# Altium footprint library JL_PCB.PCBLIB: 1112 footprints (part 29 of 71)
Each footprint in its own frame and in the unit in brackets; x right, y up, seen from the top. Pads: shape width x height; smd on the part's side, far side on the other; paste and mask are expansions set on the pad; w line width, h text height; cw(c..) or ccw(c..) is an arc to the next point about the centre after c.
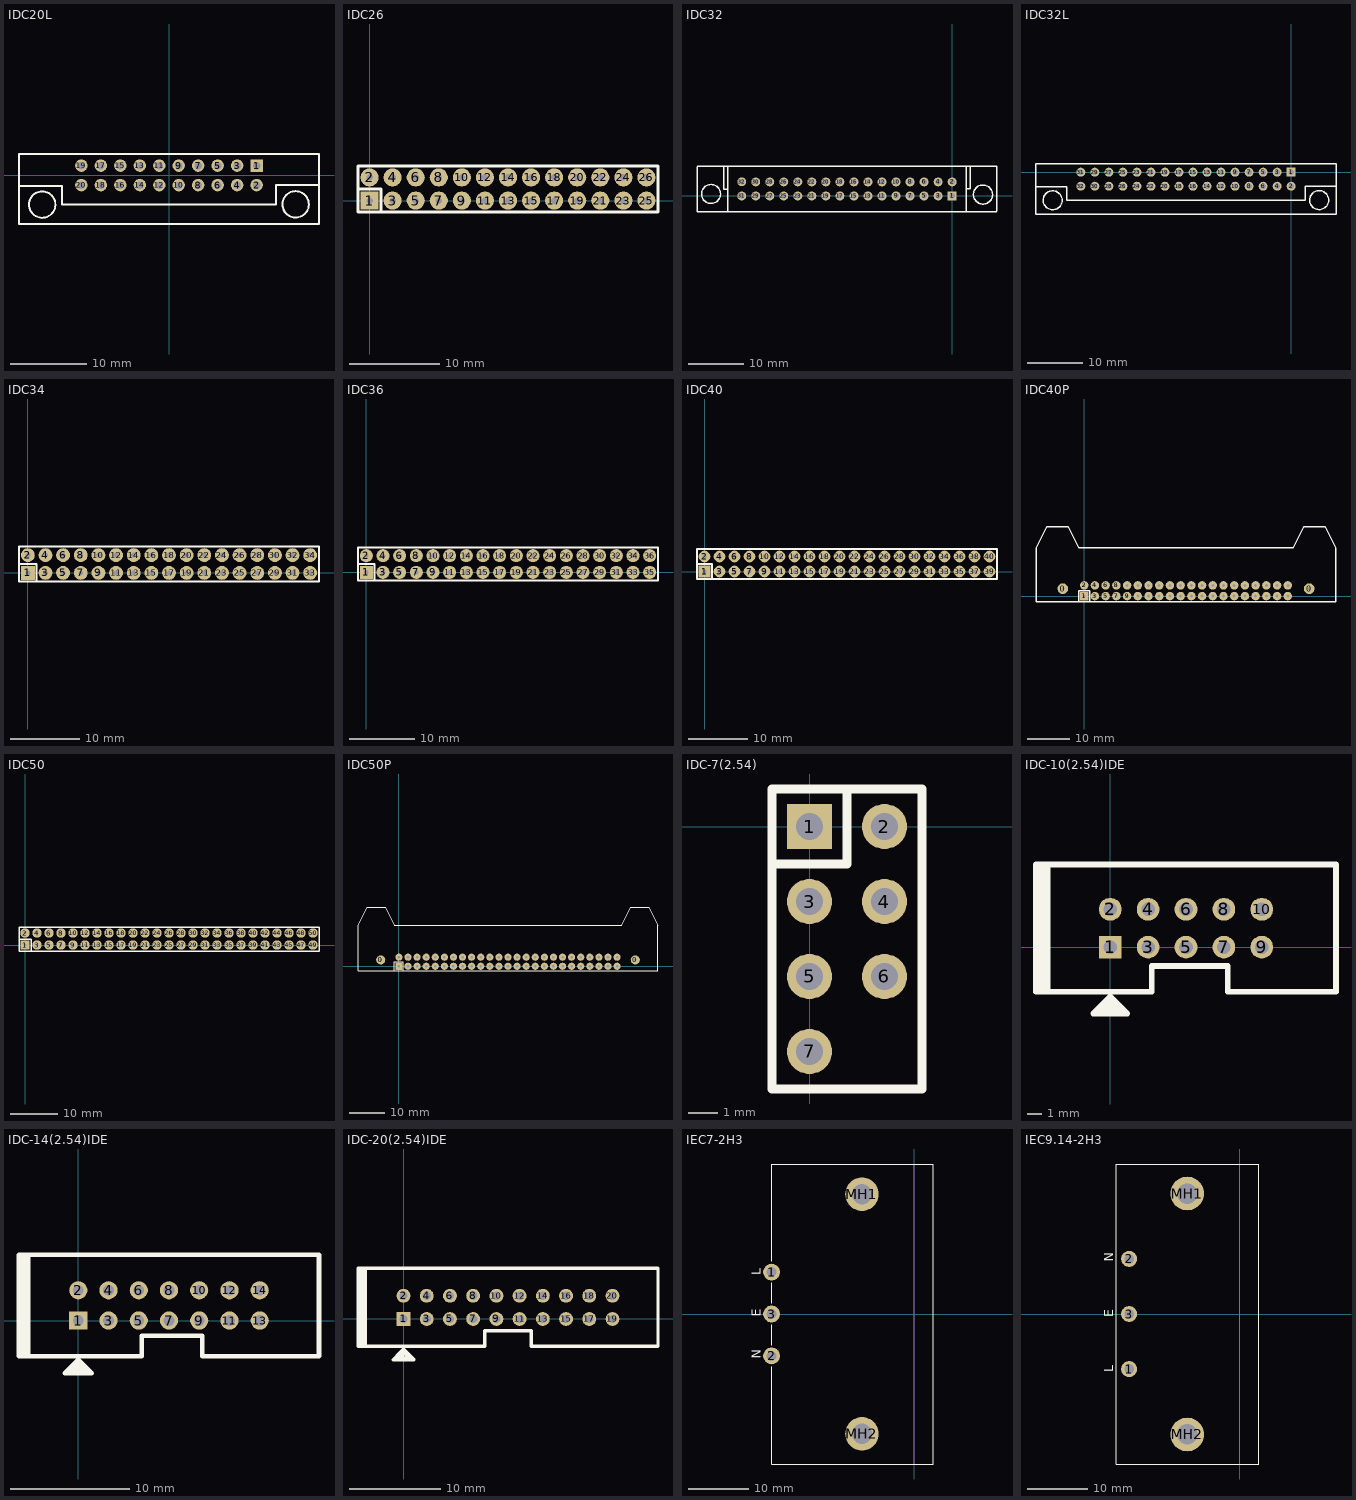
[diagram p28: the footprints below, top view; thin cyan lines are the x and y axes]

## IDC20L [mm]
pads (20):
  rect 1.618x1.618 hole 1: 1(11.43,1.27)
  round 1.618 hole 1: 2(11.43,-1.27) 3(8.89,1.27) 4(8.89,-1.27) 5(6.35,1.27) 6(6.35,-1.27) 7(3.81,1.27) 8(3.81,-1.27) 9(1.27,1.27) 10(1.27,-1.27) 11(-1.27,1.27) 12(-1.27,-1.27) 13(-3.81,1.27) 14(-3.81,-1.27) 15(-6.35,1.27) 16(-6.35,-1.27) 17(-8.89,1.27) 18(-8.89,-1.27) 19(-11.43,1.27) 20(-11.43,-1.27)
TopOverlay:
  lines w0.254: -14.814,-3.858 cw(c-16.535,-3.81) -14.814,-3.81 ; 18.231,-3.833 cw(c16.51,-3.785) 18.232,-3.785 ; -19.558,-1.397 -19.558,2.794 19.558,2.794 19.558,-1.27 ; -19.558,-1.397 -13.97,-1.397 -13.97,-3.81 13.97,-3.81 13.97,-1.27 19.558,-1.27 ; -19.558,-1.397 -19.558,-6.35 19.558,-6.35 19.558,-1.27

## IDC26 [mm]
pads (26):
  rect 2x2 hole 0.711: 1(0,0)
  round 2 hole 0.711: 2(0,2.54) 3(2.54,0) 4(2.54,2.54) 5(5.08,0) 6(5.08,2.54) 7(7.62,0) 8(7.62,2.54) 9(10.16,0) 10(10.16,2.54) 11(12.7,0) 12(12.7,2.54) 13(15.24,0) 14(15.24,2.54) 15(17.78,0) 16(17.78,2.54) 17(20.32,0) 18(20.32,2.54) 19(22.86,0) 20(22.86,2.54) 21(25.4,0) 22(25.4,2.54) 23(27.94,0) 24(27.94,2.54) 25(30.48,0) 26(30.48,2.54)
TopOverlay:
  lines w0.305: -1.27,1.27 1.27,1.27 1.27,-1.27 ; -1.27,-1.27 31.75,-1.27 31.75,3.81 -1.27,3.81 -1.27,-1.27

## IDC32 [mm]
pads (32):
  rect 1.618x1.618 hole 1: 1(0,0)
  round 1.618 hole 1: 2(0,2.54) 3(-2.54,0) 4(-2.54,2.54) 5(-5.08,0) 6(-5.08,2.54) 7(-7.62,0) 8(-7.62,2.54) 9(-10.16,0) 10(-10.16,2.54) 11(-12.7,0) 12(-12.7,2.54) 13(-15.24,0) 14(-15.24,2.54) 15(-17.78,0) 16(-17.78,2.54) 17(-20.32,0) 18(-20.32,2.54) 19(-22.86,0) 20(-22.86,2.54) 21(-25.4,0) 22(-25.4,2.54) 23(-27.94,0) 24(-27.94,2.54) 25(-30.48,0) 26(-30.48,2.54) 27(-33.02,0) 28(-33.02,2.54) 29(-35.56,0) 30(-35.56,2.54) 31(-38.1,0) 32(-38.1,2.565)
TopOverlay:
  lines w0.254: -46.203,5.309 -46.203,-2.819 8.103,-2.819 ; -46.177,5.334 8.128,5.334 8.128,-2.794 ; -41.942,0.307 cw(c-43.663,0.356) -41.941,0.356 ; -41.377,5.309 -41.377,1.245 -40.615,1.245 ; -40.615,-2.819 -40.615,5.182 ; 2.54,-2.794 2.54,5.207 ; 2.54,1.27 3.302,1.27 3.302,5.334 ; 7.314,0.2 cw(c5.588,0.254) 7.315,0.278

## IDC32L [mm]
pads (32):
  rect 1.618x1.618 hole 1: 1(0,0)
  round 1.618 hole 1: 2(0,-2.54) 3(-2.54,0) 4(-2.54,-2.54) 5(-5.08,0) 6(-5.08,-2.54) 7(-7.62,0) 8(-7.62,-2.54) 9(-10.16,0) 10(-10.16,-2.54) 11(-12.7,0) 12(-12.7,-2.54) 13(-15.24,0) 14(-15.24,-2.54) 15(-17.78,0) 16(-17.78,-2.54) 17(-20.32,0) 18(-20.32,-2.54) 19(-22.86,0) 20(-22.86,-2.54) 21(-25.4,0) 22(-25.4,-2.54) 23(-27.94,0) 24(-27.94,-2.54) 25(-30.48,0) 26(-30.48,-2.54) 27(-33.02,0) 28(-33.02,-2.54) 29(-35.56,0) 30(-35.56,-2.54) 31(-38.1,0) 32(-38.1,-2.54)
TopOverlay:
  lines w0.254: -41.484,-5.128 cw(c-43.205,-5.08) -41.484,-5.08 ; -30.988,1.524 8.128,1.524 8.128,-2.54 ; -30.836,1.524 -46.228,1.524 -46.228,-2.667 ; 6.801,-5.103 cw(c5.08,-5.055) 6.802,-5.055 ; -46.228,-2.667 -40.64,-2.667 -40.64,-5.08 -25.4,-5.08 2.54,-5.08 2.54,-2.54 8.128,-2.54 ; -46.228,-2.667 -46.228,-7.62 -30.988,-7.62 8.128,-7.62 8.128,-2.54

## IDC34 [mm]
pads (34):
  rect 2x2 hole 0.711: 1(0,0)
  round 2 hole 0.711: 2(0,2.54) 3(2.54,0) 4(2.54,2.54) 5(5.08,0) 6(5.08,2.54) 7(7.62,0) 8(7.62,2.54) 9(10.16,0) 10(10.16,2.54) 11(12.7,0) 12(12.7,2.54) 13(15.24,0) 14(15.24,2.54) 15(17.78,0) 16(17.78,2.54) 17(20.32,0) 18(20.32,2.54) 19(22.86,0) 20(22.86,2.54) 21(25.4,0) 22(25.4,2.54) 23(27.94,0) 24(27.94,2.54) 25(30.48,0) 26(30.48,2.54) 27(33.02,0) 28(33.02,2.54) 29(35.56,0) 30(35.56,2.54) 31(38.1,0) 32(38.1,2.54) 33(40.64,0) 34(40.64,2.54)
TopOverlay:
  lines w0.305: -1.27,1.27 1.27,1.27 1.27,-1.27 ; -1.27,-1.27 41.91,-1.27 41.91,3.81 -1.27,3.81 -1.27,-1.27

## IDC36 [mm]
pads (36):
  rect 2x2 hole 0.711: 1(0,0)
  round 2 hole 0.711: 2(0,2.54) 3(2.54,0) 4(2.54,2.54) 5(5.08,0) 6(5.08,2.54) 7(7.62,0) 8(7.62,2.54) 9(10.16,0) 10(10.16,2.54) 11(12.7,0) 12(12.7,2.54) 13(15.24,0) 14(15.24,2.54) 15(17.78,0) 16(17.78,2.54) 17(20.32,0) 18(20.32,2.54) 19(22.86,0) 20(22.86,2.54) 21(25.4,0) 22(25.4,2.54) 23(27.94,0) 24(27.94,2.54) 25(30.48,0) 26(30.48,2.54) 27(33.02,0) 28(33.02,2.54) 29(35.56,0) 30(35.56,2.54) 31(38.1,0) 32(38.1,2.54) 33(40.64,0) 34(40.64,2.54) 35(43.18,0) 36(43.18,2.54)
TopOverlay:
  lines w0.305: -1.27,1.27 1.27,1.27 1.27,-1.27 ; -1.27,-1.27 44.45,-1.27 44.45,3.81 -1.27,3.81 -1.27,-1.27

## IDC40 [mm]
pads (40):
  rect 2x2 hole 0.711: 1(0,0)
  round 2 hole 0.711: 2(0,2.54) 3(2.54,0) 4(2.54,2.54) 5(5.08,0) 6(5.08,2.54) 7(7.62,0) 8(7.62,2.54) 9(10.16,0) 10(10.16,2.54) 11(12.7,0) 12(12.7,2.54) 13(15.24,0) 14(15.24,2.54) 15(17.78,0) 16(17.78,2.54) 17(20.32,0) 18(20.32,2.54) 19(22.86,0) 20(22.86,2.54) 21(25.4,0) 22(25.4,2.54) 23(27.94,0) 24(27.94,2.54) 25(30.48,0) 26(30.48,2.54) 27(33.02,0) 28(33.02,2.54) 29(35.56,0) 30(35.56,2.54) 31(38.1,0) 32(38.1,2.54) 33(40.64,0) 34(40.64,2.54) 35(43.18,0) 36(43.18,2.54) 37(45.72,0) 38(45.72,2.54) 39(48.26,0) 40(48.26,2.54)
TopOverlay:
  lines w0.305: -1.27,1.27 1.27,1.27 1.27,-1.27 ; -1.27,-1.27 49.53,-1.27 49.53,3.81 -1.27,3.81 -1.27,-1.27

## IDC40P [mm]
pads (42):
  round 2.54 hole 0.711: 0(-5.08,1.778) 0(53.34,1.778)
  rect 2x2 hole 0.711: 1(0,0)
  round 2 hole 0.711: 2(0,2.54) 3(2.54,0) 4(2.54,2.54) 5(5.08,0) 6(5.08,2.54) 7(7.62,0) 8(7.62,2.54) 9(10.16,0) 10(10.16,2.54) 11(12.7,0) 12(12.7,2.54) 13(15.24,0) 14(15.24,2.54) 15(17.78,0) 16(17.78,2.54) 17(20.32,0) 18(20.32,2.54) 19(22.86,0) 20(22.86,2.54) 21(25.4,0) 22(25.4,2.54) 23(27.94,0) 24(27.94,2.54) 25(30.48,0) 26(30.48,2.54) 27(33.02,0) 28(33.02,2.54) 29(35.56,0) 30(35.56,2.54) 31(38.1,0) 32(38.1,2.54) 33(40.64,0) 34(40.64,2.54) 35(43.18,0) 36(43.18,2.54) 37(45.72,0) 38(45.72,2.54) 39(48.26,0) 40(48.26,2.54)
TopOverlay:
  lines w0.305: -1.27,-1.27 -1.27,1.27 1.27,1.27 1.27,-1.27 ; -11.43,-1.27 -11.43,11.43 -8.89,16.51 -3.81,16.51 -1.27,11.43 49.53,11.43 52.07,16.51 57.15,16.51 59.69,11.43 59.69,-1.27 -11.43,-1.27

## IDC50 [mm]
pads (50):
  rect 2x2 hole 0.711: 1(0,0)
  round 2 hole 0.711: 2(0,2.54) 3(2.54,0) 4(2.54,2.54) 5(5.08,0) 6(5.08,2.54) 7(7.62,0) 8(7.62,2.54) 9(10.16,0) 10(10.16,2.54) 11(12.7,0) 12(12.7,2.54) 13(15.24,0) 14(15.24,2.54) 15(17.78,0) 16(17.78,2.54) 17(20.32,0) 18(20.32,2.54) 19(22.86,0) 20(22.86,2.54) 21(25.4,0) 22(25.4,2.54) 23(27.94,0) 24(27.94,2.54) 25(30.48,0) 26(30.48,2.54) 27(33.02,0) 28(33.02,2.54) 29(35.56,0) 30(35.56,2.54) 31(38.1,0) 32(38.1,2.54) 33(40.64,0) 34(40.64,2.54) 35(43.18,0) 36(43.18,2.54) 37(45.72,0) 38(45.72,2.54) 39(48.26,0) 40(48.26,2.54) 41(50.8,0) 42(50.8,2.54) 43(53.34,0) 44(53.34,2.54) 45(55.88,0) 46(55.88,2.54) 47(58.42,0) 48(58.42,2.54) 49(60.96,0) 50(60.96,2.54)
TopOverlay:
  lines w0.305: -1.27,1.27 1.27,1.27 1.27,-1.27 ; -1.27,-1.27 -1.27,3.81 62.23,3.81 62.23,-1.27 -1.27,-1.27

## IDC50P [mm]
pads (52):
  round 2.54 hole 0.711: 0(-5.08,1.778) 0(66.04,1.778)
  rect 2x2 hole 0.711: 1(0,0)
  round 2 hole 0.711: 2(0,2.54) 3(2.54,0) 4(2.54,2.54) 5(5.08,0) 6(5.08,2.54) 7(7.62,0) 8(7.62,2.54) 9(10.16,0) 10(10.16,2.54) 11(12.7,0) 12(12.7,2.54) 13(15.24,0) 14(15.24,2.54) 15(17.78,0) 16(17.78,2.54) 17(20.32,0) 18(20.32,2.54) 19(22.86,0) 20(22.86,2.54) 21(25.4,0) 22(25.4,2.54) 23(27.94,0) 24(27.94,2.54) 25(30.48,0) 26(30.48,2.54) 27(33.02,0) 28(33.02,2.54) 29(35.56,0) 30(35.56,2.54) 31(38.1,0) 32(38.1,2.54) 33(40.64,0) 34(40.64,2.54) 35(43.18,0) 36(43.18,2.54) 37(45.72,0) 38(45.72,2.54) 39(48.26,0) 40(48.26,2.54) 41(50.8,0) 42(50.8,2.54) 43(53.34,0) 44(53.34,2.54) 45(55.88,0) 46(55.88,2.54) 47(58.42,0) 48(58.42,2.54) 49(60.96,0) 50(60.96,2.54)
TopOverlay:
  lines w0.305: -1.27,-1.27 -1.27,1.27 1.27,1.27 1.27,-1.27 ; -11.43,-1.27 72.39,-1.27 72.39,11.43 69.85,16.51 64.77,16.51 62.23,11.43 -1.27,11.43 -3.81,16.51 -8.89,16.51 -11.43,11.43 -11.43,-1.27

## IDC-7(2.54) [mil]
pads (7):
  rect 60x60 hole 36: 1(0,0)
  round 60 hole 36: 2(100,0) 3(0,-100) 4(100,-100) 5(0,-200) 6(100,-200) 7(0,-300)
TopOverlay:
  lines w12: -50,-50 50,-50 50,50 ; -50,-350 150,-350 150,50 -50,50 -50,-350

## IDC-10(2.54)IDE [mil]
pads (10):
  rect 60x60 hole 36: 1(0,0)
  round 60 hole 36: 2(0,100) 3(100,0) 4(100,100) 5(200,0) 6(200,100) 7(300,0) 8(300,100) 9(400,0) 10(400,100)
TopOverlay:
  lines w15: -185,-118 -185,218 ; -175,-118 -175,218 ; -165,-118 -165,218 ; -34.24,-164.24 -30.76,-164.24 -20,-175 ; -27.14,-157.15 -22.86,-157.15 -5,-175 ; -16.42,-146.42 -16.42,-148.58 10,-175 ; -9.32,-139.32 -5.68,-139.32 30,-175 ; -196,-118 -196,218 596,218 596,-118 309.84,-118 309.84,-50 109.84,-50 109.84,-118 -196,-118 ; -45,-175 0,-130 45,-175 -45,-175

## IDC-14(2.54)IDE [mil]
pads (14):
  rect 60x60 hole 36: 1(0,0)
  round 60 hole 36: 2(0,100) 3(100,0) 4(100,100) 5(200,0) 6(200,100) 7(300,0) 8(300,100) 9(400,0) 10(400,100) 11(500,0) 12(500,100) 13(600,0) 14(600,100)
TopOverlay:
  lines w15: -185,-118 -185,218 ; -175,-118 -175,218 ; -165,-118 -165,218 ; -34.24,-164.24 -30.76,-164.24 -20,-175 ; -27.14,-157.15 -22.86,-157.15 -5,-175 ; -16.42,-146.42 -16.42,-148.58 10,-175 ; -9.32,-139.32 -5.68,-139.32 30,-175 ; -196,-118 -196,218 796,218 796,-118 409.84,-118 409.84,-50 209.84,-50 209.84,-118 -196,-118 ; -45,-175 45,-175 0,-130 -45,-175

## IDC-20(2.54)IDE [mil]
pads (20):
  rect 60x60 hole 36: 1(0,0)
  round 60 hole 36: 2(0,100) 3(100,0) 4(100,100) 5(200,0) 6(200,100) 7(300,0) 8(300,100) 9(400,0) 10(400,100) 11(500,0) 12(500,100) 13(600,0) 14(600,100) 15(700,0) 16(700,100) 17(800,0) 18(800,100) 19(900,0) 20(900,100)
TopOverlay:
  lines w8: 350,-118 350,-50 ; 550,-118 550,-50
  lines w15: -185,-118 -185,218 ; -175,-118 -175,218 ; -165,-118 -165,218 ; -34.24,-164.24 -30.76,-164.24 -20,-175 ; -27.14,-157.15 -22.86,-157.15 -5,-175 ; -16.42,-146.42 -16.42,-148.58 10,-175 ; -9.32,-139.32 -5.68,-139.32 30,-175 ; -196,-118 -196,218 1096,218 1096,-118 550,-118 550,-50 350,-50 350,-118 -196,-118 ; -45,-175 0,-130 45,-175 -45,-175

## IEC7-2H3 [mm] "Mains Power Outlet, IEC60 320-2-2 F, PC Flange Rear Mount"
height 30.4
pads (5):
  round 2.8 hole 1.7: 1(-23.8,7) 2(-23.8,-7) 3(-23.8,0)
  round 5.6 hole 3.4: MH1(-8.7,20) MH2(-8.7,-20)
TopOverlay:
  lines w0.2: -23.8,-8.8 -23.8,-25.05 3.2,-25.05 3.2,25.05 -23.8,25.05 -23.8,8.8 ; -23.8,-5.2 -23.8,-1.8 ; -23.8,1.8 -23.8,5.2
  text "N" at -25.6,-7.5 h1.5
  text "E" at -25.6,-0.5 h1.5
  text "L" at -25.6,6.5 h1.5
Mechanical1:
  lines w0.1: 0,-25.05 0,25.05
  text "PCB Edge" at -0.4,-24.4 h0.5

## IEC9.14-2H3 [mm] "Mains Power Inlet, IEC60 320-1 C14, PC Flange Rear Mount"
height 27.8
pads (5):
  round 2.65 hole 1.6: 1(-18.35,-9.14) 2(-18.35,9.14) 3(-18.35,0)
  round 5.6 hole 3.4: MH1(-8.7,20) MH2(-8.7,-20)
TopOverlay:
  lines w0.2: -20.5,-24.9 -20.5,24.9 3.2,24.9 3.2,-24.9 -20.5,-24.9
  text "N" at -21,8.64 h1.5
  text "E" at -21,-0.5 h1.5
  text "L" at -21,-9.64 h1.5
Mechanical1:
  lines w0.1: 0,-24.9 0,24.9
  text "PCB Edge" at -0.383,-24.4 h0.5